# Altium schematic symbol library SCHLIB.SchLib: 2608 symbols (part 11 of 20) (continued)
## R-1.62M-0603 (continued)
RES SMD 1.62M OHM 1% 1/10W 0603; Manufacturer Part Number: CRCW06031M62FKEA; Manufacturer: Vishay Dale; Tolerance: 0.01; Power: 0.1W; Temperature Coefficient: ±100ppm/°C; Object  Type: Part; Design Item ID: R-1.62M-0603; Value: 1.62M; Composition: Thick Film; Features: Automotive AEC-Q200; Operating Temperature: -55°C ~ 155°C; Height - Seated (Max): 0.50mm; Category: Resistor
footprint R0603
pins: 1, 2

## R-1.62R-0603
designator R?, comment Package: 0603  (hidden comment: 1.62R)
RES SMD 1.62 OHM 1% 1/10W 0603; Manufacturer Part Number: CRCW06031R62FKEA; Manufacturer: Vishay Dale; Tolerance: 0.01; Power: 0.1W; Temperature Coefficient: ±100ppm/°C; Object  Type: Part; Design Item ID: R-1.62R-0603; Value: 1.62R; Composition: Thick Film; Features: Automotive AEC-Q200; Operating Temperature: -55°C ~ 155°C; Height - Seated (Max): 0.50mm; Category: Resistor
footprint R0603
pins: 1, 2

## R-1.65K-0402
designator R?, comment Package: 0402  (hidden comment: 1.65K)
RES 1.65K OHM 1% 1/16W 0402; Manufacturer Part Number: RC0402FR-071K65L; Manufacturer: YAGEO; Tolerance: 0.01; Power: 0.063W; Temperature Coefficient: ±100ppm/°C; Object  Type: Part; Design Item ID: R-1.65K-0402; Value: 1.65K; Composition: Thick Film; Features: Moisture Resistant; Operating Temperature: -55°C ~ 155°C; Height - Seated (Max): 0.40mm; Category: Resistor
footprint R0402
pins: 1, 2

## R-1.65K-0603
designator R?, comment Package: 0603  (hidden comment: 1.65K)
RES SMD 1.65K OHM 1% 1/10W 0603; Manufacturer Part Number: CRCW06031K65FKEA; Manufacturer: Vishay Dale; Tolerance: 0.01; Power: 0.1W; Temperature Coefficient: ±100ppm/°C; Object  Type: Part; Design Item ID: R-1.65K-0603; Value: 1.65K; Composition: Thick Film; Features: Automotive AEC-Q200; Operating Temperature: -55°C ~ 155°C; Height - Seated (Max): 0.50mm; Category: Resistor
footprint R0603
pins: 1, 2

## R-1.65M-0402
designator R?, comment Package: 0402  (hidden comment: 1.65M)
RES 1.65M OHM 1% 1/16W 0402; Manufacturer Part Number: RC0402FR-071M65L; Manufacturer: YAGEO; Tolerance: 0.01; Power: 0.063W; Temperature Coefficient: ±100ppm/°C; Object  Type: Part; Design Item ID: R-1.65M-0402; Value: 1.65M; Composition: Thick Film; Features: Moisture Resistant; Operating Temperature: -55°C ~ 155°C; Height - Seated (Max): 0.40mm; Category: Resistor
footprint R0402
pins: 1, 2

## R-1.65M-0603
designator R?, comment Package: 0603  (hidden comment: 1.65M)
RES SMD 1.65M OHM 1% 1/10W 0603; Manufacturer Part Number: CRCW06031M65FKEA; Manufacturer: Vishay Dale; Tolerance: 0.01; Power: 0.1W; Temperature Coefficient: ±100ppm/°C; Object  Type: Part; Design Item ID: R-1.65M-0603; Value: 1.65M; Composition: Thick Film; Features: Automotive AEC-Q200; Operating Temperature: -55°C ~ 155°C; Height - Seated (Max): 0.50mm; Category: Resistor
footprint R0603
pins: 1, 2

## R-1.65R-0603
designator R?, comment Package: 0603  (hidden comment: 1.65R)
RES SMD 1.65 OHM 1% 1/10W 0603; Manufacturer Part Number: CRCW06031R65FKEA; Manufacturer: Vishay Dale; Tolerance: 0.01; Power: 0.1W; Temperature Coefficient: ±100ppm/°C; Object  Type: Part; Design Item ID: R-1.65R-0603; Value: 1.65R; Composition: Thick Film; Features: Automotive AEC-Q200; Operating Temperature: -55°C ~ 155°C; Height - Seated (Max): 0.50mm; Category: Resistor
footprint R0603
pins: 1, 2

## R-1.69K-0402
designator R?, comment Package: 0402  (hidden comment: 1.69K)
RES 1.69K OHM 1% 1/16W 0402; Manufacturer Part Number: RC0402FR-071K69L; Manufacturer: YAGEO; Tolerance: 0.01; Power: 0.063W; Temperature Coefficient: ±100ppm/°C; Object  Type: Part; Design Item ID: R-1.69K-0402; Value: 1.69K; Composition: Thick Film; Features: Moisture Resistant; Operating Temperature: -55°C ~ 155°C; Height - Seated (Max): 0.40mm; Category: Resistor
footprint R0402
pins: 1, 2

## R-1.69K-0603
designator R?, comment Package: 0603  (hidden comment: 1.69K)
RES SMD 1.69K OHM 1% 1/10W 0603; Manufacturer Part Number: CRCW06031K69FKEA; Manufacturer: Vishay Dale; Tolerance: 0.01; Power: 0.1W; Temperature Coefficient: ±100ppm/°C; Object  Type: Part; Design Item ID: R-1.69K-0603; Value: 1.69K; Composition: Thick Film; Features: Automotive AEC-Q200; Operating Temperature: -55°C ~ 155°C; Height - Seated (Max): 0.50mm; Category: Resistor
footprint R0603
pins: 1, 2

## R-1.69M-0402
designator R?, comment Package: 0402  (hidden comment: 1.69M)
RES 1.69M OHM 1% 1/16W 0402; Manufacturer Part Number: RC0402FR-071M69L; Manufacturer: YAGEO; Tolerance: 0.01; Power: 0.063W; Temperature Coefficient: ±100ppm/°C; Object  Type: Part; Design Item ID: R-1.69M-0402; Value: 1.69M; Composition: Thick Film; Features: Moisture Resistant; Operating Temperature: -55°C ~ 155°C; Height - Seated (Max): 0.40mm; Category: Resistor
footprint R0402
pins: 1, 2

## R-1.69M-0603
designator R?, comment Package: 0603  (hidden comment: 1.69M)
RES SMD 1.69M OHM 1% 1/10W 0603; Manufacturer Part Number: CRCW06031M69FKEA; Manufacturer: Vishay Dale; Tolerance: 0.01; Power: 0.1W; Temperature Coefficient: ±100ppm/°C; Object  Type: Part; Design Item ID: R-1.69M-0603; Value: 1.69M; Composition: Thick Film; Features: Automotive AEC-Q200; Operating Temperature: -55°C ~ 155°C; Height - Seated (Max): 0.50mm; Category: Resistor
footprint R0603
pins: 1, 2

## R-1.69R-0603
designator R?, comment Package: 0603  (hidden comment: 1.69R)
RES SMD 1.69 OHM 1% 1/10W 0603; Manufacturer Part Number: CRCW06031R69FKEA; Manufacturer: Vishay Dale; Tolerance: 0.01; Power: 0.1W; Temperature Coefficient: ±100ppm/°C; Object  Type: Part; Design Item ID: R-1.69R-0603; Value: 1.69R; Composition: Thick Film; Features: Automotive AEC-Q200; Operating Temperature: -55°C ~ 155°C; Height - Seated (Max): 0.50mm; Category: Resistor
footprint R0603
pins: 1, 2

## R-1.74K-0402
designator R?, comment Package: 0402  (hidden comment: 1.74K)
RES 1.74K OHM 1% 1/16W 0402; Manufacturer Part Number: RC0402FR-071K74L; Manufacturer: YAGEO; Tolerance: 0.01; Power: 0.063W; Temperature Coefficient: ±100ppm/°C; Object  Type: Part; Design Item ID: R-1.74K-0402; Value: 1.74K; Composition: Thick Film; Features: Moisture Resistant; Operating Temperature: -55°C ~ 155°C; Height - Seated (Max): 0.40mm; Category: Resistor
footprint R0402
pins: 1, 2

## R-1.74K-0603
designator R?, comment Package: 0603  (hidden comment: 1.74K)
RES SMD 1.74K OHM 1% 1/10W 0603; Manufacturer Part Number: CRCW06031K74FKEA; Manufacturer: Vishay Dale; Tolerance: 0.01; Power: 0.1W; Temperature Coefficient: ±100ppm/°C; Object  Type: Part; Design Item ID: R-1.74K-0603; Value: 1.74K; Composition: Thick Film; Features: Automotive AEC-Q200; Operating Temperature: -55°C ~ 155°C; Height - Seated (Max): 0.50mm; Category: Resistor
footprint R0603
pins: 1, 2

## R-1.74M-0402
designator R?, comment Package: 0402  (hidden comment: 1.74M)
RES 1.74M OHM 1% 1/16W 0402; Manufacturer Part Number: RC0402FR-071M74L; Manufacturer: YAGEO; Tolerance: 0.01; Power: 0.063W; Temperature Coefficient: ±100ppm/°C; Object  Type: Part; Design Item ID: R-1.74M-0402; Value: 1.74M; Composition: Thick Film; Features: Moisture Resistant; Operating Temperature: -55°C ~ 155°C; Height - Seated (Max): 0.40mm; Category: Resistor
footprint R0402
pins: 1, 2

## R-1.74M-0603
designator R?, comment Package: 0603  (hidden comment: 1.74M)
RES SMD 1.74M OHM 1% 1/10W 0603; Manufacturer Part Number: CRCW06031M74FKEA; Manufacturer: Vishay Dale; Tolerance: 0.01; Power: 0.1W; Temperature Coefficient: ±100ppm/°C; Object  Type: Part; Design Item ID: R-1.74M-0603; Value: 1.74M; Composition: Thick Film; Features: Automotive AEC-Q200; Operating Temperature: -55°C ~ 155°C; Height - Seated (Max): 0.50mm; Category: Resistor
footprint R0603
pins: 1, 2

## R-1.74R-0603
designator R?, comment Package: 0603  (hidden comment: 1.74R)
RES SMD 1.74 OHM 1% 1/10W 0603; Manufacturer Part Number: CRCW06031R74FKEA; Manufacturer: Vishay Dale; Tolerance: 0.01; Power: 0.1W; Temperature Coefficient: ±100ppm/°C; Object  Type: Part; Design Item ID: R-1.74R-0603; Value: 1.74R; Composition: Thick Film; Features: Automotive AEC-Q200; Operating Temperature: -55°C ~ 155°C; Height - Seated (Max): 0.50mm; Category: Resistor
footprint R0603
pins: 1, 2

## R-1.78K-0402
designator R?, comment Package: 0402  (hidden comment: 1.78K)
RES 1.78K OHM 1% 1/16W 0402; Manufacturer Part Number: RC0402FR-071K78L; Manufacturer: YAGEO; Tolerance: 0.01; Power: 0.063W; Temperature Coefficient: ±100ppm/°C; Object  Type: Part; Design Item ID: R-1.78K-0402; Value: 1.78K; Composition: Thick Film; Features: Moisture Resistant; Operating Temperature: -55°C ~ 155°C; Height - Seated (Max): 0.40mm; Category: Resistor
footprint R0402
pins: 1, 2

## R-1.78K-0603
designator R?, comment Package: 0603  (hidden comment: 1.78K)
RES SMD 1.78K OHM 1% 1/10W 0603; Manufacturer Part Number: CRCW06031K78FKEA; Manufacturer: Vishay Dale; Tolerance: 0.01; Power: 0.1W; Temperature Coefficient: ±100ppm/°C; Object  Type: Part; Design Item ID: R-1.78K-0603; Value: 1.78K; Composition: Thick Film; Features: Automotive AEC-Q200; Operating Temperature: -55°C ~ 155°C; Height - Seated (Max): 0.50mm; Category: Resistor
footprint R0603
pins: 1, 2

## R-1.78M-0402
designator R?, comment Package: 0402  (hidden comment: 1.78M)
RES 1.78M OHM 1% 1/16W 0402; Manufacturer Part Number: RC0402FR-071M78L; Manufacturer: YAGEO; Tolerance: 0.01; Power: 0.063W; Temperature Coefficient: ±100ppm/°C; Object  Type: Part; Design Item ID: R-1.78M-0402; Value: 1.78M; Composition: Thick Film; Features: Moisture Resistant; Operating Temperature: -55°C ~ 155°C; Height - Seated (Max): 0.40mm; Category: Resistor
footprint R0402
pins: 1, 2

## R-1.78M-0603
designator R?, comment Package: 0603  (hidden comment: 1.78M)
RES SMD 1.78M OHM 1% 1/10W 0603; Manufacturer Part Number: CRCW06031M78FKEA; Manufacturer: Vishay Dale; Tolerance: 0.01; Power: 0.1W; Temperature Coefficient: ±100ppm/°C; Object  Type: Part; Design Item ID: R-1.78M-0603; Value: 1.78M; Composition: Thick Film; Features: Automotive AEC-Q200; Operating Temperature: -55°C ~ 155°C; Height - Seated (Max): 0.50mm; Category: Resistor
footprint R0603
pins: 1, 2

## R-1.78R-0603
designator R?, comment Package: 0603  (hidden comment: 1.78R)
RES SMD 1.78 OHM 1% 1/10W 0603; Manufacturer Part Number: CRCW06031R78FKEA; Manufacturer: Vishay Dale; Tolerance: 0.01; Power: 0.1W; Temperature Coefficient: ±100ppm/°C; Object  Type: Part; Design Item ID: R-1.78R-0603; Value: 1.78R; Composition: Thick Film; Features: Automotive AEC-Q200; Operating Temperature: -55°C ~ 155°C; Height - Seated (Max): 0.50mm; Category: Resistor
footprint R0603
pins: 1, 2

## R-1.82K-0402
designator R?, comment Package: 0402  (hidden comment: 1.82K)
RES 1.82K OHM 1% 1/16W 0402; Manufacturer Part Number: RC0402FR-071K82L; Manufacturer: YAGEO; Tolerance: 0.01; Power: 0.063W; Temperature Coefficient: ±100ppm/°C; Object  Type: Part; Design Item ID: R-1.82K-0402; Value: 1.82K; Composition: Thick Film; Features: Moisture Resistant; Operating Temperature: -55°C ~ 155°C; Height - Seated (Max): 0.40mm; Category: Resistor
footprint R0402
pins: 1, 2

## R-1.82K-0603
designator R?, comment Package: 0603  (hidden comment: 1.82K)
RES SMD 1.82K OHM 1% 1/10W 0603; Manufacturer Part Number: CRCW06031K82FKEA; Manufacturer: Vishay Dale; Tolerance: 0.01; Power: 0.1W; Temperature Coefficient: ±100ppm/°C; Object  Type: Part; Design Item ID: R-1.82K-0603; Value: 1.82K; Composition: Thick Film; Features: Automotive AEC-Q200; Operating Temperature: -55°C ~ 155°C; Height - Seated (Max): 0.50mm; Category: Resistor
footprint R0603
pins: 1, 2

## R-1.82M-0402
designator R?, comment Package: 0402  (hidden comment: 1.82M)
RES 1.82M OHM 1% 1/16W 0402; Manufacturer Part Number: RC0402FR-071M82L; Manufacturer: YAGEO; Tolerance: 0.01; Power: 0.063W; Temperature Coefficient: ±100ppm/°C; Object  Type: Part; Design Item ID: R-1.82M-0402; Value: 1.82M; Composition: Thick Film; Features: Moisture Resistant; Operating Temperature: -55°C ~ 155°C; Height - Seated (Max): 0.40mm; Category: Resistor
footprint R0402
pins: 1, 2

## R-1.82M-0603
designator R?, comment Package: 0603  (hidden comment: 1.82M)
RES SMD 1.82M OHM 1% 1/10W 0603; Manufacturer Part Number: CRCW06031M82FKEA; Manufacturer: Vishay Dale; Tolerance: 0.01; Power: 0.1W; Temperature Coefficient: ±100ppm/°C; Object  Type: Part; Design Item ID: R-1.82M-0603; Value: 1.82M; Composition: Thick Film; Features: Automotive AEC-Q200; Operating Temperature: -55°C ~ 155°C; Height - Seated (Max): 0.50mm; Category: Resistor
footprint R0603
pins: 1, 2

## R-1.82R-0603
designator R?, comment Package: 0603  (hidden comment: 1.82R)
RES SMD 1.82 OHM 1% 1/10W 0603; Manufacturer Part Number: CRCW06031R82FKEA; Manufacturer: Vishay Dale; Tolerance: 0.01; Power: 0.1W; Temperature Coefficient: ±100ppm/°C; Object  Type: Part; Design Item ID: R-1.82R-0603; Value: 1.82R; Composition: Thick Film; Features: Automotive AEC-Q200; Operating Temperature: -55°C ~ 155°C; Height - Seated (Max): 0.50mm; Category: Resistor
footprint R0603
pins: 1, 2

## R-1.87K-0402
designator R?, comment Package: 0402  (hidden comment: 1.87K)
RES 1.87K OHM 1% 1/16W 0402; Manufacturer Part Number: RC0402FR-071K87L; Manufacturer: YAGEO; Tolerance: 0.01; Power: 0.063W; Temperature Coefficient: ±100ppm/°C; Object  Type: Part; Design Item ID: R-1.87K-0402; Value: 1.87K; Composition: Thick Film; Features: Moisture Resistant; Operating Temperature: -55°C ~ 155°C; Height - Seated (Max): 0.40mm; Category: Resistor
footprint R0402
pins: 1, 2

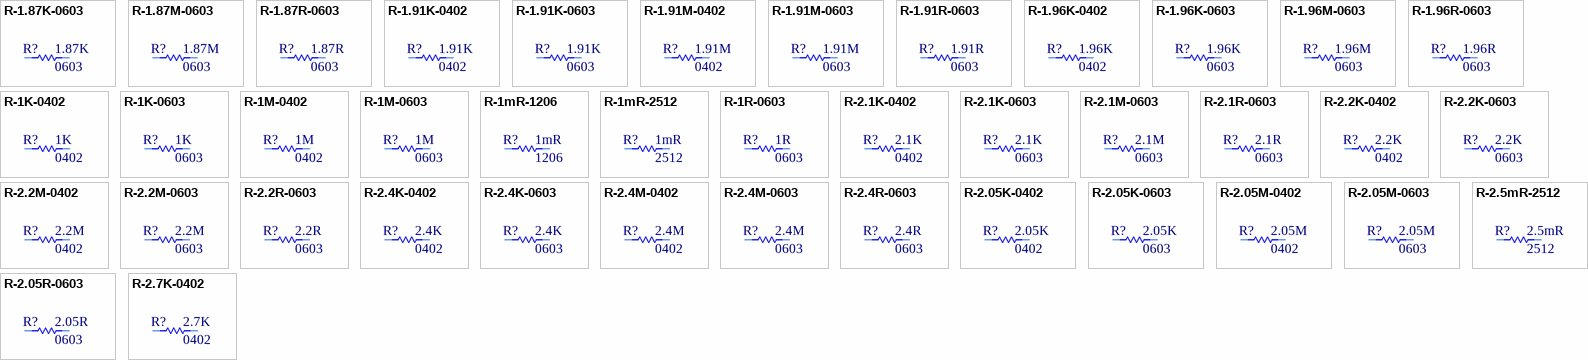
[diagram p47: symbols R-1.87K-0603 to R-2.7K-0402]

## R-1.87K-0603
designator R?, comment Package: 0603  (hidden comment: 1.87K)
RES SMD 1.87K OHM 1% 1/10W 0603; Manufacturer Part Number: CRCW06031K87FKEA; Manufacturer: Vishay Dale; Tolerance: 0.01; Power: 0.1W; Temperature Coefficient: ±100ppm/°C; Object  Type: Part; Design Item ID: R-1.87K-0603; Value: 1.87K; Composition: Thick Film; Features: Automotive AEC-Q200; Operating Temperature: -55°C ~ 155°C; Height - Seated (Max): 0.50mm; Category: Resistor
footprint R0603
pins: 1, 2

## R-1.87M-0603
designator R?, comment Package: 0603  (hidden comment: 1.87M)
RES SMD 1.87M OHM 1% 1/10W 0603; Manufacturer Part Number: CRCW06031M87FKEA; Manufacturer: Vishay Dale; Tolerance: 0.01; Power: 0.1W; Temperature Coefficient: ±100ppm/°C; Object  Type: Part; Design Item ID: R-1.87M-0603; Value: 1.87M; Composition: Thick Film; Features: Automotive AEC-Q200; Operating Temperature: -55°C ~ 155°C; Height - Seated (Max): 0.50mm; Category: Resistor
footprint R0603
pins: 1, 2

## R-1.87R-0603
designator R?, comment Package: 0603  (hidden comment: 1.87R)
RES SMD 1.87 OHM 1% 1/10W 0603; Manufacturer Part Number: CRCW06031R87FKEA; Manufacturer: Vishay Dale; Tolerance: 0.01; Power: 0.1W; Temperature Coefficient: ±100ppm/°C; Object  Type: Part; Design Item ID: R-1.87R-0603; Value: 1.87R; Composition: Thick Film; Features: Automotive AEC-Q200; Operating Temperature: -55°C ~ 155°C; Height - Seated (Max): 0.50mm; Category: Resistor
footprint R0603
pins: 1, 2

## R-1.91K-0402
designator R?, comment Package: 0402  (hidden comment: 1.91K)
RES 1.91K OHM 1% 1/16W 0402; Manufacturer Part Number: RC0402FR-071K91L; Manufacturer: YAGEO; Tolerance: 0.01; Power: 0.063W; Temperature Coefficient: ±100ppm/°C; Object  Type: Part; Design Item ID: R-1.91K-0402; Value: 1.91K; Composition: Thick Film; Features: Moisture Resistant; Operating Temperature: -55°C ~ 155°C; Height - Seated (Max): 0.40mm; Category: Resistor
footprint R0402
pins: 1, 2

## R-1.91K-0603
designator R?, comment Package: 0603  (hidden comment: 1.91K)
RES SMD 1.91K OHM 1% 1/10W 0603; Manufacturer Part Number: CRCW06031K91FKEA; Manufacturer: Vishay Dale; Tolerance: 0.01; Power: 0.1W; Temperature Coefficient: ±100ppm/°C; Object  Type: Part; Design Item ID: R-1.91K-0603; Value: 1.91K; Composition: Thick Film; Features: Automotive AEC-Q200; Operating Temperature: -55°C ~ 155°C; Height - Seated (Max): 0.50mm; Category: Resistor
footprint R0603
pins: 1, 2

## R-1.91M-0402
designator R?, comment Package: 0402  (hidden comment: 1.91M)
RES 1.91M OHM 1% 1/16W 0402; Manufacturer Part Number: RC0402FR-071M91L; Manufacturer: YAGEO; Tolerance: 0.01; Power: 0.063W; Temperature Coefficient: ±100ppm/°C; Object  Type: Part; Design Item ID: R-1.91M-0402; Value: 1.91M; Composition: Thick Film; Features: Moisture Resistant; Operating Temperature: -55°C ~ 155°C; Height - Seated (Max): 0.40mm; Category: Resistor
footprint R0402
pins: 1, 2

## R-1.91M-0603
designator R?, comment Package: 0603  (hidden comment: 1.91M)
RES SMD 1.91M OHM 1% 1/10W 0603; Manufacturer Part Number: CRCW06031M91FKEA; Manufacturer: Vishay Dale; Tolerance: 0.01; Power: 0.1W; Temperature Coefficient: ±100ppm/°C; Object  Type: Part; Design Item ID: R-1.91M-0603; Value: 1.91M; Composition: Thick Film; Features: Automotive AEC-Q200; Operating Temperature: -55°C ~ 155°C; Height - Seated (Max): 0.50mm; Category: Resistor
footprint R0603
pins: 1, 2

## R-1.91R-0603
designator R?, comment Package: 0603  (hidden comment: 1.91R)
RES SMD 1.91 OHM 1% 1/10W 0603; Manufacturer Part Number: CRCW06031R91FKEA; Manufacturer: Vishay Dale; Tolerance: 0.01; Power: 0.1W; Temperature Coefficient: ±100ppm/°C; Object  Type: Part; Design Item ID: R-1.91R-0603; Value: 1.91R; Composition: Thick Film; Features: Automotive AEC-Q200; Operating Temperature: -55°C ~ 155°C; Height - Seated (Max): 0.50mm; Category: Resistor
footprint R0603
pins: 1, 2

## R-1.96K-0402
designator R?, comment Package: 0402  (hidden comment: 1.96K)
RES 1.96K OHM 1% 1/16W 0402; Manufacturer Part Number: RC0402FR-071K96L; Manufacturer: YAGEO; Tolerance: 0.01; Power: 0.063W; Temperature Coefficient: ±100ppm/°C; Object  Type: Part; Design Item ID: R-1.96K-0402; Value: 1.96K; Composition: Thick Film; Features: Moisture Resistant; Operating Temperature: -55°C ~ 155°C; Height - Seated (Max): 0.40mm; Category: Resistor
footprint R0402
pins: 1, 2

## R-1.96K-0603
designator R?, comment Package: 0603  (hidden comment: 1.96K)
RES SMD 1.96K OHM 1% 1/10W 0603; Manufacturer Part Number: CRCW06031K96FKEA; Manufacturer: Vishay Dale; Tolerance: 0.01; Power: 0.1W; Temperature Coefficient: ±100ppm/°C; Object  Type: Part; Design Item ID: R-1.96K-0603; Value: 1.96K; Composition: Thick Film; Features: Automotive AEC-Q200; Operating Temperature: -55°C ~ 155°C; Height - Seated (Max): 0.50mm; Category: Resistor
footprint R0603
pins: 1, 2

## R-1.96M-0603
designator R?, comment Package: 0603  (hidden comment: 1.96M)
RES SMD 1.96M OHM 1% 1/10W 0603; Manufacturer Part Number: CRCW06031M96FKEA; Manufacturer: Vishay Dale; Tolerance: 0.01; Power: 0.1W; Temperature Coefficient: ±100ppm/°C; Object  Type: Part; Design Item ID: R-1.96M-0603; Value: 1.96M; Composition: Thick Film; Features: Automotive AEC-Q200; Operating Temperature: -55°C ~ 155°C; Height - Seated (Max): 0.50mm; Category: Resistor
footprint R0603
pins: 1, 2

## R-1.96R-0603
designator R?, comment Package: 0603  (hidden comment: 1.96R)
RES SMD 1.96 OHM 1% 1/10W 0603; Manufacturer Part Number: CRCW06031R96FKEA; Manufacturer: Vishay Dale; Tolerance: 0.01; Power: 0.1W; Temperature Coefficient: ±100ppm/°C; Object  Type: Part; Design Item ID: R-1.96R-0603; Value: 1.96R; Composition: Thick Film; Features: Automotive AEC-Q200; Operating Temperature: -55°C ~ 155°C; Height - Seated (Max): 0.50mm; Category: Resistor
footprint R0603
pins: 1, 2

## R-1K-0402
designator R?, comment Package: 0402  (hidden comment: 1K)
RES 1K OHM 1% 1/16W 0402; Manufacturer Part Number: RC0402FR-071KL; Manufacturer: YAGEO; Tolerance: 0.01; Power: 0.063W; Temperature Coefficient: ±100ppm/°C; Object  Type: Part; Design Item ID: R-1K-0402; Value: 1K; Composition: Thick Film; Features: Moisture Resistant; Operating Temperature: -55°C ~ 155°C; Height - Seated (Max): 0.40mm; Category: Resistor
footprint R0402
pins: 1, 2

## R-1K-0603
designator R?, comment Package: 0603  (hidden comment: 1K)
RES SMD 1K OHM 1% 1/10W 0603; Manufacturer Part Number: CRCW06031K00FKEA; Manufacturer: Vishay Dale; Tolerance: 0.01; Power: 0.1W; Temperature Coefficient: ±100ppm/°C; Object  Type: Part; Design Item ID: R-1K-0603; Value: 1K; Composition: Thick Film; Features: Automotive AEC-Q200; Operating Temperature: -55°C ~ 155°C; Height - Seated (Max): 0.50mm; Category: Resistor
footprint R0603
pins: 1, 2

## R-1M-0402
designator R?, comment Package: 0402  (hidden comment: 1M)
RES 1M OHM 1% 1/16W 0402; Manufacturer Part Number: RC0402FR-071ML; Manufacturer: YAGEO; Tolerance: 0.01; Power: 0.063W; Temperature Coefficient: ±100ppm/°C; Object  Type: Part; Design Item ID: R-1M-0402; Value: 1M; Composition: Thick Film; Features: Moisture Resistant; Operating Temperature: -55°C ~ 155°C; Height - Seated (Max): 0.40mm; Category: Resistor
footprint R0402
pins: 1, 2

## R-1M-0603
designator R?, comment Package: 0603  (hidden comment: 1M)
RES SMD 1M OHM 1% 1/10W 0603; Manufacturer Part Number: CRCW06031M00FKEA; Manufacturer: Vishay Dale; Tolerance: 0.01; Power: 0.1W; Temperature Coefficient: ±100ppm/°C; Object  Type: Part; Design Item ID: R-1M-0603; Value: 1M; Composition: Thick Film; Features: Automotive AEC-Q200; Operating Temperature: -55°C ~ 155°C; Height - Seated (Max): 0.50mm; Category: Resistor
footprint R0603
pins: 1, 2

## R-1mR-1206
designator R?, comment Package: 1206  (hidden comment: 1mR)
RES 0.001 OHM 1% 1/4W 1206; Manufacturer Part Number: WSL12061L000FEA; Manufacturer: Vishay Dale; Tolerance: 0.01; Power: 0.25W; Temperature Coefficient: ±275ppm/°C; Object  Type: Part; Design Item ID: R-1mR-1206; Value: 1mR; Composition: Metal Element; Features: Anti-Sulfur, Automotive AEC-Q200, Current Sense, Moisture Resistant, Pulse Withstanding; Operating Temperature: -65°C ~ 170°C; Height - Seated (Max): 0.89mm; Category: Resistor
footprint R1206
pins: 1, 2

## R-1mR-2512
designator R?, comment Package: 2512  (hidden comment: 1mR)
RES 0.001 OHM 1% 1W 2512; Manufacturer Part Number: WSL25121L000FEA; Manufacturer: Vishay Dale; Tolerance: 0.01; Temperature Coefficient: ±275ppm/°C; Object  Type: Part; Design Item ID: R-1mR-2512; Value: 1mR; Power: 1W; Composition: Metal Element; Features: Anti-Sulfur, Automotive AEC-Q200, Current Sense, Moisture Resistant, Pulse Withstanding; Operating Temperature: -65°C ~ 170°C; Height - Seated (Max): 0.89mm; Category: Resistor
footprint R2512
pins: 1, 2

## R-1R-0603
designator R?, comment Package: 0603  (hidden comment: 1R)
RES SMD 1 OHM 1% 1/10W 0603; Manufacturer Part Number: CRCW06031R00FKEA; Manufacturer: Vishay Dale; Tolerance: 0.01; Power: 0.1W; Temperature Coefficient: ±100ppm/°C; Object  Type: Part; Design Item ID: R-1R-0603; Value: 1R; Composition: Thick Film; Features: Automotive AEC-Q200; Operating Temperature: -55°C ~ 155°C; Height - Seated (Max): 0.50mm; Category: Resistor
footprint R0603
pins: 1, 2

## R-2.1K-0402
designator R?, comment Package: 0402  (hidden comment: 2.1K)
RES 2.1K OHM 1% 1/16W 0402; Manufacturer Part Number: RC0402FR-072K1L; Manufacturer: YAGEO; Tolerance: 0.01; Power: 0.063W; Temperature Coefficient: ±100ppm/°C; Object  Type: Part; Design Item ID: R-2.1K-0402; Value: 2.1K; Composition: Thick Film; Features: Moisture Resistant; Operating Temperature: -55°C ~ 155°C; Height - Seated (Max): 0.40mm; Category: Resistor
footprint R0402
pins: 1, 2

## R-2.1K-0603
designator R?, comment Package: 0603  (hidden comment: 2.1K)
RES SMD 2.1K OHM 1% 1/10W 0603; Manufacturer Part Number: CRCW06032K10FKEA; Manufacturer: Vishay Dale; Tolerance: 0.01; Power: 0.1W; Temperature Coefficient: ±100ppm/°C; Object  Type: Part; Design Item ID: R-2.1K-0603; Value: 2.1K; Composition: Thick Film; Features: Automotive AEC-Q200; Operating Temperature: -55°C ~ 155°C; Height - Seated (Max): 0.50mm; Category: Resistor
footprint R0603
pins: 1, 2

## R-2.1M-0603
designator R?, comment Package: 0603  (hidden comment: 2.1M)
RES SMD 2.1M OHM 1% 1/10W 0603; Manufacturer Part Number: CRCW06032M10FKEA; Manufacturer: Vishay Dale; Tolerance: 0.01; Power: 0.1W; Temperature Coefficient: ±100ppm/°C; Object  Type: Part; Design Item ID: R-2.1M-0603; Value: 2.1M; Composition: Thick Film; Features: Automotive AEC-Q200; Operating Temperature: -55°C ~ 155°C; Height - Seated (Max): 0.50mm; Category: Resistor
footprint R0603
pins: 1, 2

## R-2.1R-0603
designator R?, comment Package: 0603  (hidden comment: 2.1R)
RES SMD 2.1 OHM 1% 1/10W 0603; Manufacturer Part Number: CRCW06032R10FKEA; Manufacturer: Vishay Dale; Tolerance: 0.01; Power: 0.1W; Temperature Coefficient: ±100ppm/°C; Object  Type: Part; Design Item ID: R-2.1R-0603; Value: 2.1R; Composition: Thick Film; Features: Automotive AEC-Q200; Operating Temperature: -55°C ~ 155°C; Height - Seated (Max): 0.50mm; Category: Resistor
footprint R0603
pins: 1, 2

## R-2.2K-0402
designator R?, comment Package: 0402  (hidden comment: 2.2K)
RES 2.2K OHM 1% 1/16W 0402; Manufacturer Part Number: RC0402FR-072K2L; Manufacturer: YAGEO; Tolerance: 0.01; Power: 0.063W; Temperature Coefficient: ±100ppm/°C; Object  Type: Part; Design Item ID: R-2.2K-0402; Value: 2.2K; Composition: Thick Film; Features: Moisture Resistant; Operating Temperature: -55°C ~ 155°C; Height - Seated (Max): 0.40mm; Category: Resistor
footprint R0402
pins: 1, 2

## R-2.2K-0603
designator R?, comment Package: 0603  (hidden comment: 2.2K)
RES SMD 2.2K OHM 1% 1/10W 0603; Manufacturer Part Number: CRCW06032K20FKEA; Manufacturer: Vishay Dale; Tolerance: 0.01; Power: 0.1W; Temperature Coefficient: ±100ppm/°C; Object  Type: Part; Design Item ID: R-2.2K-0603; Value: 2.2K; Composition: Thick Film; Features: Automotive AEC-Q200; Operating Temperature: -55°C ~ 155°C; Height - Seated (Max): 0.50mm; Category: Resistor
footprint R0603
pins: 1, 2

## R-2.2M-0402
designator R?, comment Package: 0402  (hidden comment: 2.2M)
RES 2.2M OHM 1% 1/16W 0402; Manufacturer Part Number: RC0402FR-072M2L; Manufacturer: YAGEO; Tolerance: 0.01; Power: 0.063W; Temperature Coefficient: ±100ppm/°C; Object  Type: Part; Design Item ID: R-2.2M-0402; Value: 2.2M; Composition: Thick Film; Features: Moisture Resistant; Operating Temperature: -55°C ~ 155°C; Height - Seated (Max): 0.40mm; Category: Resistor
footprint R0402
pins: 1, 2

## R-2.2M-0603
designator R?, comment Package: 0603  (hidden comment: 2.2M)
RES SMD 2.2M OHM 1% 1/10W 0603; Manufacturer Part Number: CRCW06032M20FKEA; Manufacturer: Vishay Dale; Tolerance: 0.01; Power: 0.1W; Temperature Coefficient: ±100ppm/°C; Object  Type: Part; Design Item ID: R-2.2M-0603; Value: 2.2M; Composition: Thick Film; Features: Automotive AEC-Q200; Operating Temperature: -55°C ~ 155°C; Height - Seated (Max): 0.50mm; Category: Resistor
footprint R0603
pins: 1, 2

## R-2.2R-0603
designator R?, comment Package: 0603  (hidden comment: 2.2R)
RES SMD 2.2 OHM 1% 1/10W 0603; Manufacturer Part Number: CRCW06032R20FKEA; Manufacturer: Vishay Dale; Tolerance: 0.01; Power: 0.1W; Temperature Coefficient: ±100ppm/°C; Object  Type: Part; Design Item ID: R-2.2R-0603; Value: 2.2R; Composition: Thick Film; Features: Automotive AEC-Q200; Operating Temperature: -55°C ~ 155°C; Height - Seated (Max): 0.50mm; Category: Resistor
footprint R0603
pins: 1, 2

## R-2.4K-0402
designator R?, comment Package: 0402  (hidden comment: 2.4K)
RES 2.4K OHM 1% 1/16W 0402; Manufacturer Part Number: RC0402FR-072K4L; Manufacturer: YAGEO; Tolerance: 0.01; Power: 0.063W; Temperature Coefficient: ±100ppm/°C; Object  Type: Part; Design Item ID: R-2.4K-0402; Value: 2.4K; Composition: Thick Film; Features: Moisture Resistant; Operating Temperature: -55°C ~ 155°C; Height - Seated (Max): 0.40mm; Category: Resistor
footprint R0402
pins: 1, 2

## R-2.4K-0603
designator R?, comment Package: 0603  (hidden comment: 2.4K)
RES SMD 2.4K OHM 1% 1/10W 0603; Manufacturer Part Number: CRCW06032K40FKEA; Manufacturer: Vishay Dale; Tolerance: 0.01; Power: 0.1W; Temperature Coefficient: ±100ppm/°C; Object  Type: Part; Design Item ID: R-2.4K-0603; Value: 2.4K; Composition: Thick Film; Features: Automotive AEC-Q200; Operating Temperature: -55°C ~ 155°C; Height - Seated (Max): 0.50mm; Category: Resistor
footprint R0603
pins: 1, 2

## R-2.4M-0402
designator R?, comment Package: 0402  (hidden comment: 2.4M)
RES 2.4M OHM 1% 1/16W 0402; Manufacturer Part Number: RC0402FR-072M4L; Manufacturer: YAGEO; Tolerance: 0.01; Power: 0.063W; Temperature Coefficient: ±100ppm/°C; Object  Type: Part; Design Item ID: R-2.4M-0402; Value: 2.4M; Composition: Thick Film; Features: Moisture Resistant; Operating Temperature: -55°C ~ 155°C; Height - Seated (Max): 0.40mm; Category: Resistor
footprint R0402
pins: 1, 2

## R-2.4M-0603
designator R?, comment Package: 0603  (hidden comment: 2.4M)
RES SMD 2.4M OHM 1% 1/10W 0603; Manufacturer Part Number: CRCW06032M40FKEA; Manufacturer: Vishay Dale; Tolerance: 0.01; Power: 0.1W; Temperature Coefficient: ±100ppm/°C; Object  Type: Part; Design Item ID: R-2.4M-0603; Value: 2.4M; Composition: Thick Film; Features: Automotive AEC-Q200; Operating Temperature: -55°C ~ 155°C; Height - Seated (Max): 0.50mm; Category: Resistor
footprint R0603
pins: 1, 2

## R-2.4R-0603
designator R?, comment Package: 0603  (hidden comment: 2.4R)
RES SMD 2.4 OHM 1% 1/10W 0603; Manufacturer Part Number: CRCW06032R40FKEA; Manufacturer: Vishay Dale; Tolerance: 0.01; Power: 0.1W; Temperature Coefficient: ±100ppm/°C; Object  Type: Part; Design Item ID: R-2.4R-0603; Value: 2.4R; Composition: Thick Film; Features: Automotive AEC-Q200; Operating Temperature: -55°C ~ 155°C; Height - Seated (Max): 0.50mm; Category: Resistor
footprint R0603
pins: 1, 2

## R-2.05K-0402
designator R?, comment Package: 0402  (hidden comment: 2.05K)
RES 2.05K OHM 1% 1/16W 0402; Manufacturer Part Number: RC0402FR-072K05L; Manufacturer: YAGEO; Tolerance: 0.01; Power: 0.063W; Temperature Coefficient: ±100ppm/°C; Object  Type: Part; Design Item ID: R-2.05K-0402; Value: 2.05K; Composition: Thick Film; Features: Moisture Resistant; Operating Temperature: -55°C ~ 155°C; Height - Seated (Max): 0.40mm; Category: Resistor
footprint R0402
pins: 1, 2

## R-2.05K-0603
designator R?, comment Package: 0603  (hidden comment: 2.05K)
RES SMD 2.05K OHM 1% 1/10W 0603; Manufacturer Part Number: CRCW06032K05FKEA; Manufacturer: Vishay Dale; Tolerance: 0.01; Power: 0.1W; Temperature Coefficient: ±100ppm/°C; Object  Type: Part; Design Item ID: R-2.05K-0603; Value: 2.05K; Composition: Thick Film; Features: Automotive AEC-Q200; Operating Temperature: -55°C ~ 155°C; Height - Seated (Max): 0.50mm; Category: Resistor
footprint R0603
pins: 1, 2

## R-2.05M-0402
designator R?, comment Package: 0402  (hidden comment: 2.05M)
RES 2.05M OHM 1% 1/16W 0402; Manufacturer Part Number: RC0402FR-072M05L; Manufacturer: YAGEO; Tolerance: 0.01; Power: 0.063W; Temperature Coefficient: ±100ppm/°C; Object  Type: Part; Design Item ID: R-2.05M-0402; Value: 2.05M; Composition: Thick Film; Features: Moisture Resistant; Operating Temperature: -55°C ~ 155°C; Height - Seated (Max): 0.40mm; Category: Resistor
footprint R0402
pins: 1, 2

## R-2.05M-0603
designator R?, comment Package: 0603  (hidden comment: 2.05M)
RES SMD 2.05M OHM 1% 1/10W 0603; Manufacturer Part Number: CRCW06032M05FKEA; Manufacturer: Vishay Dale; Tolerance: 0.01; Power: 0.1W; Temperature Coefficient: ±100ppm/°C; Object  Type: Part; Design Item ID: R-2.05M-0603; Value: 2.05M; Composition: Thick Film; Features: Automotive AEC-Q200; Operating Temperature: -55°C ~ 155°C; Height - Seated (Max): 0.50mm; Category: Resistor
footprint R0603
pins: 1, 2

## R-2.5mR-2512
designator R?, comment Package: 2512  (hidden comment: 2.5mR)
RES 0.0025 OHM 1% 1W 2512; Manufacturer Part Number: WSL25122L500FEA; Manufacturer: Vishay Dale; Tolerance: 0.01; Temperature Coefficient: ±275ppm/°C; Object  Type: Part; Design Item ID: R-2.5mR-2512; Value: 2.5mR; Power: 1W; Composition: Metal Element; Features: Anti-Sulfur, Automotive AEC-Q200, Current Sense, Moisture Resistant, Pulse Withstanding; Operating Temperature: -65°C ~ 170°C; Height - Seated (Max): 0.89mm; Category: Resistor
footprint R2512
pins: 1, 2

## R-2.05R-0603
designator R?, comment Package: 0603  (hidden comment: 2.05R)
RES SMD 2.05 OHM 1% 1/10W 0603; Manufacturer Part Number: CRCW06032R05FKEA; Manufacturer: Vishay Dale; Tolerance: 0.01; Power: 0.1W; Temperature Coefficient: ±100ppm/°C; Object  Type: Part; Design Item ID: R-2.05R-0603; Value: 2.05R; Composition: Thick Film; Features: Automotive AEC-Q200; Operating Temperature: -55°C ~ 155°C; Height - Seated (Max): 0.50mm; Category: Resistor
footprint R0603
pins: 1, 2

## R-2.7K-0402
designator R?, comment Package: 0402  (hidden comment: 2.7K)
RES 2.7K OHM 1% 1/16W 0402; Manufacturer Part Number: RC0402FR-072K7L; Manufacturer: YAGEO; Tolerance: 0.01; Power: 0.063W; Temperature Coefficient: ±100ppm/°C; Object  Type: Part; Design Item ID: R-2.7K-0402; Value: 2.7K; Composition: Thick Film; Features: Moisture Resistant; Operating Temperature: -55°C ~ 155°C; Height - Seated (Max): 0.40mm; Category: Resistor
footprint R0402
pins: 1, 2

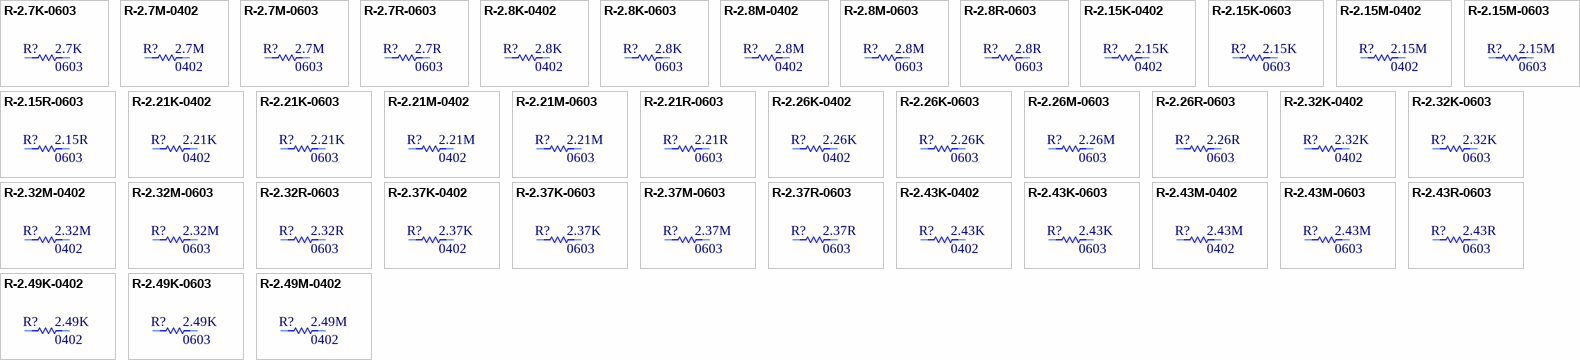
[diagram p48: symbols R-2.7K-0603 to R-2.49M-0402]

## R-2.7K-0603
designator R?, comment Package: 0603  (hidden comment: 2.7K)
RES SMD 2.7K OHM 1% 1/10W 0603; Manufacturer Part Number: CRCW06032K70FKEA; Manufacturer: Vishay Dale; Tolerance: 0.01; Power: 0.1W; Temperature Coefficient: ±100ppm/°C; Object  Type: Part; Design Item ID: R-2.7K-0603; Value: 2.7K; Composition: Thick Film; Features: Automotive AEC-Q200; Operating Temperature: -55°C ~ 155°C; Height - Seated (Max): 0.50mm; Category: Resistor
footprint R0603
pins: 1, 2

## R-2.7M-0402
designator R?, comment Package: 0402  (hidden comment: 2.7M)
RES 2.7M OHM 1% 1/16W 0402; Manufacturer Part Number: RC0402FR-072M7L; Manufacturer: YAGEO; Tolerance: 0.01; Power: 0.063W; Temperature Coefficient: ±100ppm/°C; Object  Type: Part; Design Item ID: R-2.7M-0402; Value: 2.7M; Composition: Thick Film; Features: Moisture Resistant; Operating Temperature: -55°C ~ 155°C; Height - Seated (Max): 0.40mm; Category: Resistor
footprint R0402
pins: 1, 2

## R-2.7M-0603
designator R?, comment Package: 0603  (hidden comment: 2.7M)
RES SMD 2.7M OHM 1% 1/10W 0603; Manufacturer Part Number: CRCW06032M70FKEA; Manufacturer: Vishay Dale; Tolerance: 0.01; Power: 0.1W; Temperature Coefficient: ±100ppm/°C; Object  Type: Part; Design Item ID: R-2.7M-0603; Value: 2.7M; Composition: Thick Film; Features: Automotive AEC-Q200; Operating Temperature: -55°C ~ 155°C; Height - Seated (Max): 0.50mm; Category: Resistor
footprint R0603
pins: 1, 2

## R-2.7R-0603
designator R?, comment Package: 0603  (hidden comment: 2.7R)
RES SMD 2.7 OHM 1% 1/10W 0603; Manufacturer Part Number: CRCW06032R70FKEA; Manufacturer: Vishay Dale; Tolerance: 0.01; Power: 0.1W; Temperature Coefficient: ±100ppm/°C; Object  Type: Part; Design Item ID: R-2.7R-0603; Value: 2.7R; Composition: Thick Film; Features: Automotive AEC-Q200; Operating Temperature: -55°C ~ 155°C; Height - Seated (Max): 0.50mm; Category: Resistor
footprint R0603
pins: 1, 2

## R-2.8K-0402
designator R?, comment Package: 0402  (hidden comment: 2.8K)
RES 2.8K OHM 1% 1/16W 0402; Manufacturer Part Number: RC0402FR-072K8L; Manufacturer: YAGEO; Tolerance: 0.01; Power: 0.063W; Temperature Coefficient: ±100ppm/°C; Object  Type: Part; Design Item ID: R-2.8K-0402; Value: 2.8K; Composition: Thick Film; Features: Moisture Resistant; Operating Temperature: -55°C ~ 155°C; Height - Seated (Max): 0.40mm; Category: Resistor
footprint R0402
pins: 1, 2

## R-2.8K-0603
designator R?, comment Package: 0603  (hidden comment: 2.8K)
RES SMD 2.8K OHM 1% 1/10W 0603; Manufacturer Part Number: CRCW06032K80FKEA; Manufacturer: Vishay Dale; Tolerance: 0.01; Power: 0.1W; Temperature Coefficient: ±100ppm/°C; Object  Type: Part; Design Item ID: R-2.8K-0603; Value: 2.8K; Composition: Thick Film; Features: Automotive AEC-Q200; Operating Temperature: -55°C ~ 155°C; Height - Seated (Max): 0.50mm; Category: Resistor
footprint R0603
pins: 1, 2

## R-2.8M-0402
designator R?, comment Package: 0402  (hidden comment: 2.8M)
RES 2.8M OHM 1% 1/16W 0402; Manufacturer Part Number: RC0402FR-072M8L; Manufacturer: YAGEO; Tolerance: 0.01; Power: 0.063W; Temperature Coefficient: ±100ppm/°C; Object  Type: Part; Design Item ID: R-2.8M-0402; Value: 2.8M; Composition: Thick Film; Features: Moisture Resistant; Operating Temperature: -55°C ~ 155°C; Height - Seated (Max): 0.40mm; Category: Resistor
footprint R0402
pins: 1, 2

## R-2.8M-0603
designator R?, comment Package: 0603  (hidden comment: 2.8M)
RES SMD 2.8M OHM 1% 1/10W 0603; Manufacturer Part Number: CRCW06032M80FKEA; Manufacturer: Vishay Dale; Tolerance: 0.01; Power: 0.1W; Temperature Coefficient: ±100ppm/°C; Object  Type: Part; Design Item ID: R-2.8M-0603; Value: 2.8M; Composition: Thick Film; Features: Automotive AEC-Q200; Operating Temperature: -55°C ~ 155°C; Height - Seated (Max): 0.50mm; Category: Resistor
footprint R0603
pins: 1, 2

## R-2.8R-0603
designator R?, comment Package: 0603  (hidden comment: 2.8R)
RES SMD 2.8 OHM 1% 1/10W 0603; Manufacturer Part Number: CRCW06032R80FKEA; Manufacturer: Vishay Dale; Tolerance: 0.01; Power: 0.1W; Temperature Coefficient: ±100ppm/°C; Object  Type: Part; Design Item ID: R-2.8R-0603; Value: 2.8R; Composition: Thick Film; Features: Automotive AEC-Q200; Operating Temperature: -55°C ~ 155°C; Height - Seated (Max): 0.50mm; Category: Resistor
footprint R0603
pins: 1, 2

## R-2.15K-0402
designator R?, comment Package: 0402  (hidden comment: 2.15K)
RES 2.15K OHM 1% 1/16W 0402; Manufacturer Part Number: RC0402FR-072K15L; Manufacturer: YAGEO; Tolerance: 0.01; Power: 0.063W; Temperature Coefficient: ±100ppm/°C; Object  Type: Part; Design Item ID: R-2.15K-0402; Value: 2.15K; Composition: Thick Film; Features: Moisture Resistant; Operating Temperature: -55°C ~ 155°C; Height - Seated (Max): 0.40mm; Category: Resistor
footprint R0402
pins: 1, 2

## R-2.15K-0603
designator R?, comment Package: 0603  (hidden comment: 2.15K)
RES SMD 2.15K OHM 1% 1/10W 0603; Manufacturer Part Number: CRCW06032K15FKEA; Manufacturer: Vishay Dale; Tolerance: 0.01; Power: 0.1W; Temperature Coefficient: ±100ppm/°C; Object  Type: Part; Design Item ID: R-2.15K-0603; Value: 2.15K; Composition: Thick Film; Features: Automotive AEC-Q200; Operating Temperature: -55°C ~ 155°C; Height - Seated (Max): 0.50mm; Category: Resistor
footprint R0603
pins: 1, 2

## R-2.15M-0402
designator R?, comment Package: 0402  (hidden comment: 2.15M)
RES 2.15M OHM 1% 1/16W 0402; Manufacturer Part Number: RC0402FR-072M15L; Manufacturer: YAGEO; Tolerance: 0.01; Power: 0.063W; Temperature Coefficient: ±100ppm/°C; Object  Type: Part; Design Item ID: R-2.15M-0402; Value: 2.15M; Composition: Thick Film; Features: Moisture Resistant; Operating Temperature: -55°C ~ 155°C; Height - Seated (Max): 0.40mm; Category: Resistor
footprint R0402
pins: 1, 2

## R-2.15M-0603
designator R?, comment Package: 0603  (hidden comment: 2.15M)
RES SMD 2.15M OHM 1% 1/10W 0603; Manufacturer Part Number: CRCW06032M15FKEA; Manufacturer: Vishay Dale; Tolerance: 0.01; Power: 0.1W; Temperature Coefficient: ±100ppm/°C; Object  Type: Part; Design Item ID: R-2.15M-0603; Value: 2.15M; Composition: Thick Film; Features: Automotive AEC-Q200; Operating Temperature: -55°C ~ 155°C; Height - Seated (Max): 0.50mm; Category: Resistor
footprint R0603
pins: 1, 2

## R-2.15R-0603
designator R?, comment Package: 0603  (hidden comment: 2.15R)
RES SMD 2.15 OHM 1% 1/10W 0603; Manufacturer Part Number: CRCW06032R15FKEA; Manufacturer: Vishay Dale; Tolerance: 0.01; Power: 0.1W; Temperature Coefficient: ±100ppm/°C; Object  Type: Part; Design Item ID: R-2.15R-0603; Value: 2.15R; Composition: Thick Film; Features: Automotive AEC-Q200; Operating Temperature: -55°C ~ 155°C; Height - Seated (Max): 0.50mm; Category: Resistor
footprint R0603
pins: 1, 2

## R-2.21K-0402
designator R?, comment Package: 0402  (hidden comment: 2.21K)
RES 2.21K OHM 1% 1/16W 0402; Manufacturer Part Number: RC0402FR-072K21L; Manufacturer: YAGEO; Tolerance: 0.01; Power: 0.063W; Temperature Coefficient: ±100ppm/°C; Object  Type: Part; Design Item ID: R-2.21K-0402; Value: 2.21K; Composition: Thick Film; Features: Moisture Resistant; Operating Temperature: -55°C ~ 155°C; Height - Seated (Max): 0.40mm; Category: Resistor
footprint R0402
pins: 1, 2

## R-2.21K-0603
designator R?, comment Package: 0603  (hidden comment: 2.21K)
RES SMD 2.21K OHM 1% 1/10W 0603; Manufacturer Part Number: CRCW06032K21FKEA; Manufacturer: Vishay Dale; Tolerance: 0.01; Power: 0.1W; Temperature Coefficient: ±100ppm/°C; Object  Type: Part; Design Item ID: R-2.21K-0603; Value: 2.21K; Composition: Thick Film; Features: Automotive AEC-Q200; Operating Temperature: -55°C ~ 155°C; Height - Seated (Max): 0.50mm; Category: Resistor
footprint R0603
pins: 1, 2

## R-2.21M-0402
designator R?, comment Package: 0402  (hidden comment: 2.21M)
RES 2.21M OHM 1% 1/16W 0402; Manufacturer Part Number: RC0402FR-072M21L; Manufacturer: YAGEO; Tolerance: 0.01; Power: 0.063W; Temperature Coefficient: ±100ppm/°C; Object  Type: Part; Design Item ID: R-2.21M-0402; Value: 2.21M; Composition: Thick Film; Features: Moisture Resistant; Operating Temperature: -55°C ~ 155°C; Height - Seated (Max): 0.40mm; Category: Resistor
footprint R0402
pins: 1, 2

## R-2.21M-0603
designator R?, comment Package: 0603  (hidden comment: 2.21M)
RES SMD 2.21M OHM 1% 1/10W 0603; Manufacturer Part Number: CRCW06032M21FKEA; Manufacturer: Vishay Dale; Tolerance: 0.01; Power: 0.1W; Temperature Coefficient: ±100ppm/°C; Object  Type: Part; Design Item ID: R-2.21M-0603; Value: 2.21M; Composition: Thick Film; Features: Automotive AEC-Q200; Operating Temperature: -55°C ~ 155°C; Height - Seated (Max): 0.50mm; Category: Resistor
footprint R0603
pins: 1, 2

## R-2.21R-0603
designator R?, comment Package: 0603  (hidden comment: 2.21R)
RES SMD 2.21 OHM 1% 1/10W 0603; Manufacturer Part Number: CRCW06032R21FKEA; Manufacturer: Vishay Dale; Tolerance: 0.01; Power: 0.1W; Temperature Coefficient: ±100ppm/°C; Object  Type: Part; Design Item ID: R-2.21R-0603; Value: 2.21R; Composition: Thick Film; Features: Automotive AEC-Q200; Operating Temperature: -55°C ~ 155°C; Height - Seated (Max): 0.50mm; Category: Resistor
footprint R0603
pins: 1, 2

## R-2.26K-0402
designator R?, comment Package: 0402  (hidden comment: 2.26K)
RES 2.26K OHM 1% 1/16W 0402; Manufacturer Part Number: RC0402FR-072K26L; Manufacturer: YAGEO; Tolerance: 0.01; Power: 0.063W; Temperature Coefficient: ±100ppm/°C; Object  Type: Part; Design Item ID: R-2.26K-0402; Value: 2.26K; Composition: Thick Film; Features: Moisture Resistant; Operating Temperature: -55°C ~ 155°C; Height - Seated (Max): 0.40mm; Category: Resistor
footprint R0402
pins: 1, 2